# Altium footprint library WR-TBL_Pluggable PCB Header.PcbLib: 719 footprints (part 19 of 45)
Each footprint in its own frame and in the unit in brackets; x right, y up, seen from the top. Pads: shape width x height; smd on the part's side, far side on the other; paste and mask are expansions set on the pad; w line width, h text height; cw(c..) or ccw(c..) is an arc to the next point about the centre after c.
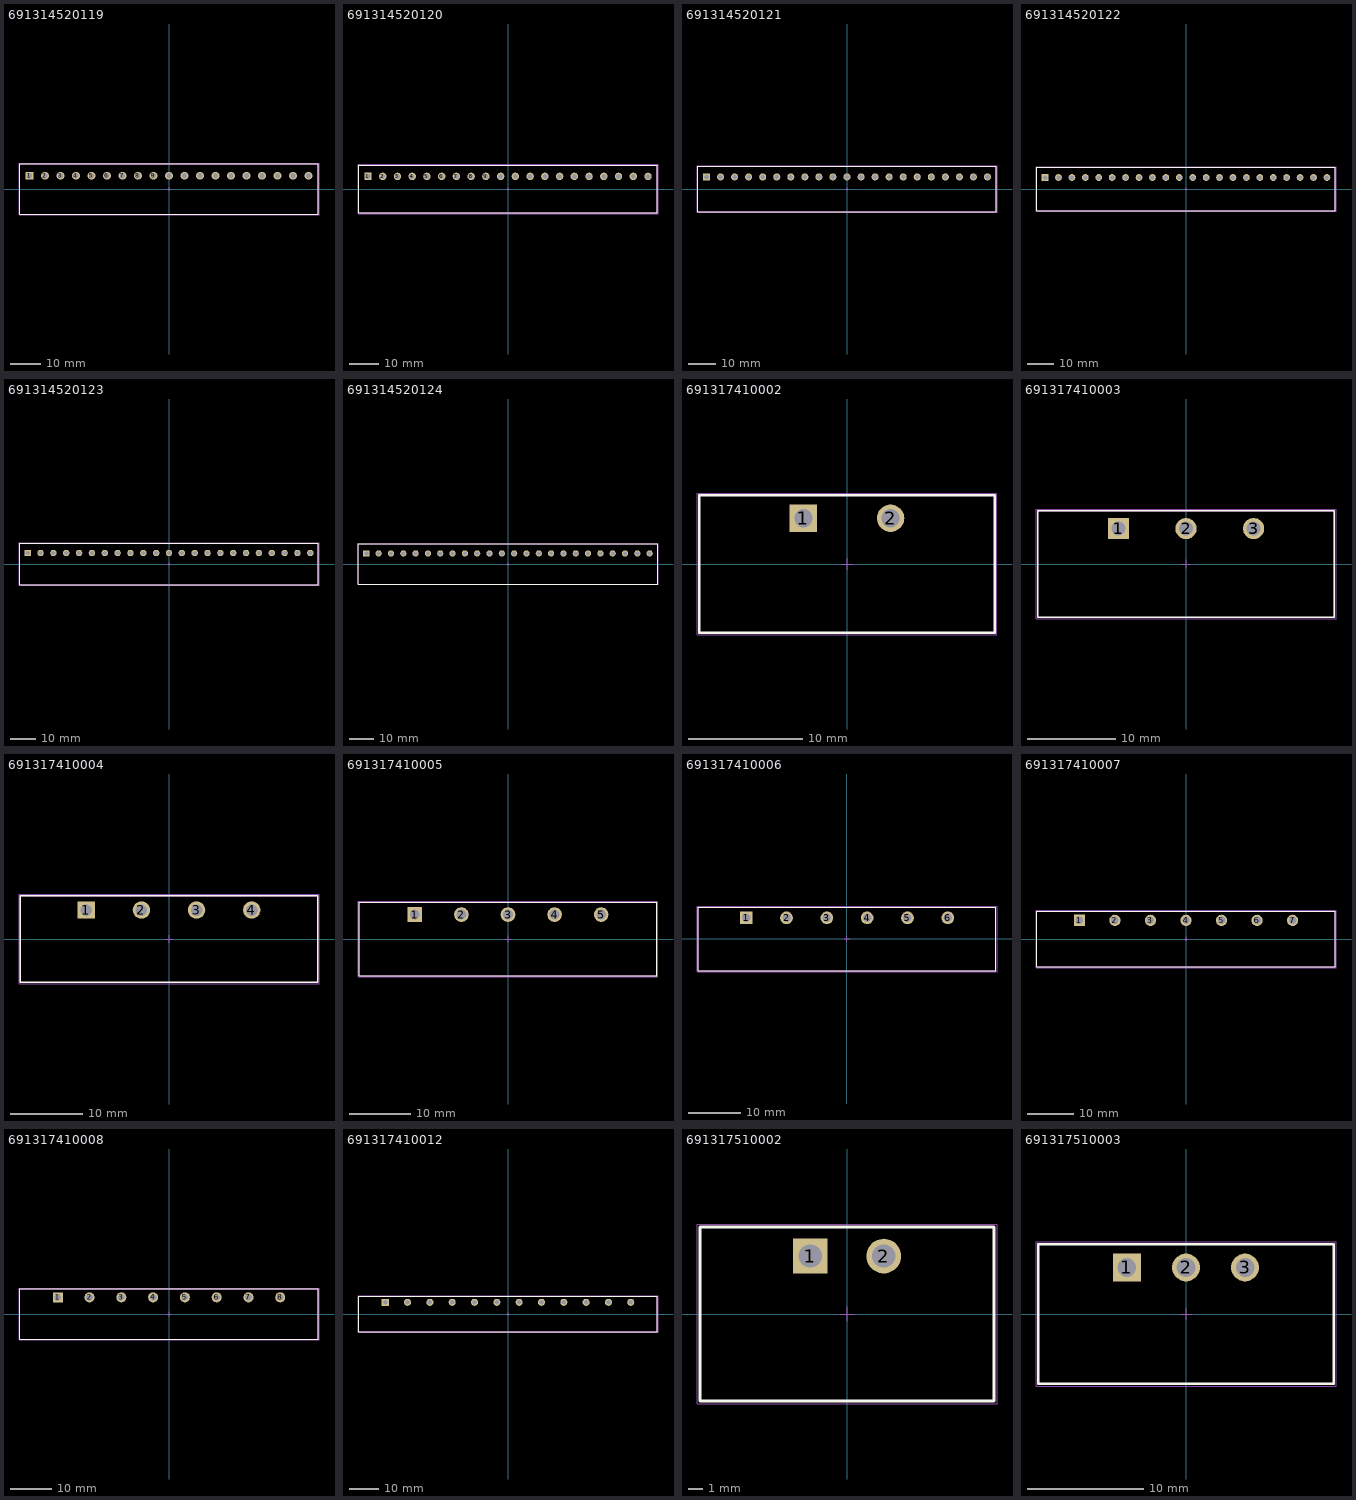
[diagram p18: the footprints below, top view; thin cyan lines are the x and y axes]

## 691314520119 [mm] "5,08mm - PCB Headers - 45°- 19p"
height 14.5
pads (19):
  rect 2.55x2.55 hole 1.7: 1(-45.72,4.35)
  round 2.55 hole 1.7: 2(-40.64,4.35) 3(-35.56,4.35) 4(-30.48,4.35) 5(-25.4,4.35) 6(-20.32,4.35) 7(-15.24,4.35) 8(-10.16,4.35) 9(-5.08,4.35) 10(0,4.35) 11(5.08,4.35) 12(10.16,4.35) 13(15.24,4.35) 14(20.32,4.35) 15(25.4,4.35) 16(30.48,4.35) 17(35.56,4.35) 18(40.64,4.35) 19(45.72,4.35)
Top Overlay:
  lines w0.2: -48.96,-8.25 48.96,-8.25 48.96,8.25 -48.96,8.25 -48.96,-8.25
Mechanical 13:
  lines w0.1: -48.96,-8.25 -48.96,8.25 48.96,8.25 48.96,-8.25 -48.96,-8.25
Mechanical 15:
  lines w0.05: -0.5,0 0.5,0 ; 0,-0.5 0,0.5 ; -49.16,-8.45 -49.16,8.45 49.16,8.45 49.16,-8.45 -49.16,-8.45
3D body "691314520119.stp": height 14.55, standoff -4.05, extent -48.96,-8.25 48.96,8.25

## 691314520120 [mm] "5,08mm - PCB Headers - 45°- 20p"
height 14.5
pads (20):
  rect 2.55x2.55 hole 1.7: 1(-48.26,4.35)
  round 2.55 hole 1.7: 2(-43.18,4.35) 3(-38.1,4.35) 4(-33.02,4.35) 5(-27.94,4.35) 6(-22.86,4.35) 7(-17.78,4.35) 8(-12.7,4.35) 9(-7.62,4.35) 10(-2.54,4.35) 11(2.54,4.35) 12(7.62,4.35) 13(12.7,4.35) 14(17.78,4.35) 15(22.86,4.35) 16(27.94,4.35) 17(33.02,4.35) 18(38.1,4.35) 19(43.18,4.35) 20(48.26,4.35)
Top Overlay:
  lines w0.2: -51.5,-8.25 -51.5,8.25 51.5,8.25 51.5,-8.25 -51.5,-8.25
Mechanical 13:
  lines w0.1: -51.5,-8.25 51.5,-8.25 51.5,8.25 -51.5,8.25 -51.5,-8.25
Mechanical 15:
  lines w0.05: -0.5,0 0.5,0 ; 0,-0.5 0,0.5 ; -51.7,-8.45 51.7,-8.45 51.7,8.45 -51.7,8.45 -51.7,-8.45
3D body "691314520120.stp": height 14.55, standoff -4.05, extent -51.5,-8.25 51.5,8.25

## 691314520121 [mm] "5,08mm - PCB Headers - 45°- 21p"
height 14.5
pads (21):
  rect 2.55x2.55 hole 1.7: 1(-50.8,4.35)
  round 2.55 hole 1.7: 2(-45.72,4.35) 3(-40.64,4.35) 4(-35.56,4.35) 5(-30.48,4.35) 6(-25.4,4.35) 7(-20.32,4.35) 8(-15.24,4.35) 9(-10.16,4.35) 10(-5.08,4.35) 11(0,4.35) 12(5.08,4.35) 13(10.16,4.35) 14(15.24,4.35) 15(20.32,4.35) 16(25.4,4.35) 17(30.48,4.35) 18(35.56,4.35) 19(40.64,4.35) 20(45.72,4.35) 21(50.8,4.35)
Top Overlay:
  lines w0.2: -54.04,-8.25 54.04,-8.25 54.04,8.25 -54.04,8.25 -54.04,-8.25
Mechanical 13:
  lines w0.1: -54.04,-8.25 -54.04,8.25 54.04,8.25 54.04,-8.25 -54.04,-8.25
Mechanical 15:
  lines w0.05: -0.5,0 0.5,0 ; 0,-0.5 0,0.5 ; -54.24,-8.45 -54.24,8.45 54.24,8.45 54.24,-8.45 -54.24,-8.45
3D body "691314520121.stp": height 14.55, standoff -4.05, extent -54.04,-8.25 54.04,8.25

## 691314520122 [mm] "5,08mm - PCB Headers - 45°- 22p"
height 14.5
pads (22):
  rect 2.55x2.55 hole 1.7: 1(-53.34,4.35)
  round 2.55 hole 1.7: 2(-48.26,4.35) 3(-43.18,4.35) 4(-38.1,4.35) 5(-33.02,4.35) 6(-27.94,4.35) 7(-22.86,4.35) 8(-17.78,4.35) 9(-12.7,4.35) 10(-7.62,4.35) 11(-2.54,4.35) 12(2.54,4.35) 13(7.62,4.35) 14(12.7,4.35) 15(17.78,4.35) 16(22.86,4.35) 17(27.94,4.35) 18(33.02,4.35) 19(38.1,4.35) 20(43.18,4.35) 21(48.26,4.35) 22(53.34,4.35)
Top Overlay:
  lines w0.2: -56.58,-8.25 -56.58,8.25 56.58,8.25 56.58,-8.25 -56.58,-8.25
Mechanical 13:
  lines w0.1: -56.58,-8.25 56.58,-8.25 56.58,8.25 -56.58,8.25 -56.58,-8.25
Mechanical 15:
  lines w0.05: -0.5,0 0.5,0 ; 0,-0.5 0,0.5 ; -56.78,-8.45 56.78,-8.45 56.78,8.45 -56.78,8.45 -56.78,-8.45
3D body "691314520122.stp": height 14.55, standoff -4.05, extent -56.58,-8.25 56.58,8.25

## 691314520123 [mm] "5,08mm - PCB Headers - 45°- 23p"
height 14.5
pads (23):
  rect 2.55x2.55 hole 1.7: 1(-55.88,4.35)
  round 2.55 hole 1.7: 2(-50.8,4.35) 3(-45.72,4.35) 4(-40.64,4.35) 5(-35.56,4.35) 6(-30.48,4.35) 7(-25.4,4.35) 8(-20.32,4.35) 9(-15.24,4.35) 10(-10.16,4.35) 11(-5.08,4.35) 12(0,4.35) 13(5.08,4.35) 14(10.16,4.35) 15(15.24,4.35) 16(20.32,4.35) 17(25.4,4.35) 18(30.48,4.35) 19(35.56,4.35) 20(40.64,4.35) 21(45.72,4.35) 22(50.8,4.35) 23(55.88,4.35)
Top Overlay:
  lines w0.2: -59.12,-8.25 -59.12,8.25 59.12,8.25 59.12,-8.25 -59.12,-8.25
Mechanical 13:
  lines w0.1: -59.12,-8.25 59.12,-8.25 59.12,8.25 -59.12,8.25 -59.12,-8.25
Mechanical 15:
  lines w0.05: -0.5,0 0.5,0 ; 0,-0.5 0,0.5 ; -59.32,-8.45 59.32,-8.45 59.32,8.45 -59.32,8.45 -59.32,-8.45
3D body "691314520123.stp": height 14.55, standoff -4.05, extent -59.12,-8.25 59.12,8.25

## 691314520124 [mm] "5,08mm - PCB Headers - 45°- 24p"
height 14.5
pads (24):
  rect 2.55x2.55 hole 1.7: 1(-58.42,4.35)
  round 2.55 hole 1.7: 2(-53.34,4.35) 3(-48.26,4.35) 4(-43.18,4.35) 5(-38.1,4.35) 6(-33.02,4.35) 7(-27.94,4.35) 8(-22.86,4.35) 9(-17.78,4.35) 10(-12.7,4.35) 11(-7.62,4.35) 12(-2.54,4.35) 13(2.54,4.35) 14(7.62,4.35) 15(12.7,4.35) 16(17.78,4.35) 17(22.86,4.35) 18(27.94,4.35) 19(33.02,4.35) 20(38.1,4.35) 21(43.18,4.35) 22(48.26,4.35) 23(53.34,4.35) 24(58.42,4.35)
Top Overlay:
  lines w0.2: -61.66,-8.25 -61.66,8.25 61.66,8.25 61.66,-8.25 -61.66,-8.25
Mechanical 13:
  lines w0.1: -61.66,-8.25 61.66,-8.25 61.66,8.25 -61.66,8.25 -61.66,-8.25
Mechanical 15:
  lines w0.05: -0.5,0 0.5,0 ; 0,-0.5 0,0.5 ; -61.86,-8.45 61.86,-8.45 61.86,8.45 -61.86,8.45 -61.86,-8.45
3D body "691314520124.stp": height 14.55, standoff -4.05, extent -61.66,-8.25 61.66,8.25

## 691317410002 [mm] "7.62 mm - Closed Horizonal PCB Header with Flanges - 2p"
height 8.5
pads (2):
  rect 2.4x2.4 hole 1.6: 1(-3.81,4)
  round 2.4 hole 1.6: 2(3.81,4)
Top Overlay:
  lines w0.2: -12.91,-6 -12.91,6 12.91,6 12.91,-6 -12.91,-6
Mechanical 13:
  lines w0.1: -12.91,-6 12.91,-6 12.91,6 -12.91,6 -12.91,-6
Mechanical 15:
  lines w0.05: -0.5,0 0.5,0 ; 0,-0.5 0,0.5 ; -13.11,-6.2 -13.11,6.2 13.11,6.2 13.11,-6.2 -13.11,-6.2
3D body "691317410002.stp": height 8.55, standoff -3.95, extent -12.91,-6 12.91,6

## 691317410003 [mm] "7.62 mm - Closed Horizonal PCB Header with Flanges - 3p"
height 8.5
pads (3):
  rect 2.4x2.4 hole 1.6: 1(-7.62,4)
  round 2.4 hole 1.6: 2(0,4) 3(7.62,4)
Top Overlay:
  lines w0.2: -16.72,-6 16.72,-6 16.72,6 -16.72,6 -16.72,-6
Mechanical 13:
  lines w0.1: -16.72,-6 -16.72,6 16.72,6 16.72,-6 -16.72,-6
Mechanical 15:
  lines w0.05: -0.5,0 0.5,0 ; 0,-0.5 0,0.5 ; -16.92,-6.2 16.92,-6.2 16.92,6.2 -16.92,6.2 -16.92,-6.2
3D body "691317410003.stp": height 8.55, standoff -3.95, extent -16.72,-6 16.72,6

## 691317410004 [mm] "7.62 mm - Closed Horizonal PCB Header with Flanges - 4p"
height 8.5
pads (4):
  rect 2.4x2.4 hole 1.6: 1(-11.43,4)
  round 2.4 hole 1.6: 2(-3.81,4) 3(3.81,4) 4(11.43,4)
Top Overlay:
  lines w0.2: -20.53,-6 20.53,-6 20.53,6 -20.53,6 -20.53,-6
Mechanical 13:
  lines w0.1: -20.53,-6 -20.53,6 20.53,6 20.53,-6 -20.53,-6
Mechanical 15:
  lines w0.05: -0.5,0 0.5,0 ; 0,-0.5 0,0.5 ; -20.73,-6.2 20.73,-6.2 20.73,6.2 -20.73,6.2 -20.73,-6.2
3D body "691317410004.stp": height 8.55, standoff -3.95, extent -20.53,-6 20.53,6

## 691317410005 [mm] "7.62 mm - Closed Horizonal PCB Header with Flanges - 5p"
height 8.5
pads (5):
  rect 2.4x2.4 hole 1.6: 1(-15.24,4)
  round 2.4 hole 1.6: 2(-7.62,4) 3(0,4) 4(7.62,4) 5(15.24,4)
Top Overlay:
  lines w0.2: -24.34,-6 24.34,-6 24.34,6 -24.34,6 -24.34,-6
Mechanical 13:
  lines w0.1: -24.34,-6 -24.34,6 24.34,6 24.34,-6 -24.34,-6
Mechanical 15:
  lines w0.05: -0.5,0 0.5,0 ; 0,-0.5 0,0.5 ; -24.54,-6.2 24.54,-6.2 24.54,6.2 -24.54,6.2 -24.54,-6.2
3D body "691317410005.stp": height 8.55, standoff -3.95, extent -24.34,-6 24.34,6

## 691317410006 [mm] "7.62 mm - Closed Horizonal PCB Header with Flanges - 6p"
height 8.5
pads (6):
  rect 2.4x2.4 hole 1.6: 1(-19.05,4)
  round 2.4 hole 1.6: 2(-11.43,4) 3(-3.81,4) 4(3.81,4) 5(11.43,4) 6(19.05,4)
Top Overlay:
  lines w0.2: -28.15,-6 -28.15,6 28.15,6 28.15,-6 -28.15,-6
Mechanical 13:
  lines w0.1: -28.15,-6 28.15,-6 28.15,6 -28.15,6 -28.15,-6
Mechanical 15:
  lines w0.05: -0.5,0 0.5,0 ; 0,-0.5 0,0.5 ; -28.35,-6.2 -28.35,6.2 28.35,6.2 28.35,-6.2 -28.35,-6.2
3D body "691317410006.stp": height 8.55, standoff -3.95, extent -28.15,-6 28.15,6

## 691317410007 [mm] "7.62 mm - Closed Horizonal PCB Header with Flanges - 7p"
height 8.5
pads (7):
  rect 2.4x2.4 hole 1.6: 1(-22.86,4)
  round 2.4 hole 1.6: 2(-15.24,4) 3(-7.62,4) 4(0,4) 5(7.62,4) 6(15.24,4) 7(22.86,4)
Top Overlay:
  lines w0.2: -31.96,-6 -31.96,6 31.96,6 31.96,-6 -31.96,-6
Mechanical 13:
  lines w0.1: -31.96,-6 31.96,-6 31.96,6 -31.96,6 -31.96,-6
Mechanical 15:
  lines w0.05: -0.5,0 0.5,0 ; 0,-0.5 0,0.5 ; -32.16,-6.2 -32.16,6.2 32.16,6.2 32.16,-6.2 -32.16,-6.2
3D body "691317410007.stp": height 8.55, standoff -3.95, extent -31.96,-6 31.96,6

## 691317410008 [mm] "7.62 mm - Closed Horizonal PCB Header with Flanges - 8p"
height 8.5
pads (8):
  rect 2.4x2.4 hole 1.6: 1(-26.67,4)
  round 2.4 hole 1.6: 2(-19.05,4) 3(-11.43,4) 4(-3.81,4) 5(3.81,4) 6(11.43,4) 7(19.05,4) 8(26.67,4)
Top Overlay:
  lines w0.2: -35.77,-6 -35.77,6 35.77,6 35.77,-6 -35.77,-6
Mechanical 13:
  lines w0.1: -35.77,-6 35.77,-6 35.77,6 -35.77,6 -35.77,-6
Mechanical 15:
  lines w0.05: -0.5,0 0.5,0 ; 0,-0.5 0,0.5 ; -35.97,-6.2 -35.97,6.2 35.97,6.2 35.97,-6.2 -35.97,-6.2
3D body "691317410008.stp": height 8.55, standoff -3.95, extent -35.77,-6 35.77,6

## 691317410012 [mm] "7.62 mm - Closed Horizonal PCB Header with Flanges - 12p"
height 8.5
pads (12):
  rect 2.4x2.4 hole 1.6: 1(-41.91,4)
  round 2.4 hole 1.6: 2(-34.29,4) 3(-26.67,4) 4(-19.05,4) 5(-11.43,4) 6(-3.81,4) 7(3.81,4) 8(11.43,4) 9(19.05,4) 10(26.67,4) 11(34.29,4) 12(41.91,4)
Top Overlay:
  lines w0.2: -51.01,-6 -51.01,6 51.01,6 51.01,-6 -51.01,-6
Mechanical 13:
  lines w0.1: -51.01,-6 51.01,-6 51.01,6 -51.01,6 -51.01,-6
Mechanical 15:
  lines w0.05: -0.5,0 0.5,0 ; 0,-0.5 0,0.5 ; -51.21,-6.2 -51.21,6.2 51.21,6.2 51.21,-6.2 -51.21,-6.2
3D body "691317410012.stp": height 8.55, standoff -3.95, extent -51.01,-6 51.01,6

## 691317510002 [mm] "5,08mm - PCB Horizontal Closed With flanges - 02p"
height 8.5
pads (2):
  rect 2.4x2.4 hole 1.6: 1(-2.54,4)
  round 2.4 hole 1.6: 2(2.54,4)
Top Overlay:
  lines w0.2: -10.16,-6 10.16,-6 10.16,6 -10.16,6 -10.16,-6
Mechanical 13:
  lines w0.1: -10.16,-6 -10.16,6 10.16,6 10.16,-6 -10.16,-6
Mechanical 15:
  lines w0.05: -0.5,0 0.5,0 ; 0,-0.5 0,0.5 ; -10.36,-6.2 -10.36,6.2 10.36,6.2 10.36,-6.2 -10.36,-6.2
3D body "691317510002.stp": height 8.55, standoff -3.45, extent -10.16,-6 10.16,6

## 691317510003 [mm] "5,08mm - PCB Horizontal Closed With flanges - 03p"
height 8.5
pads (3):
  rect 2.4x2.4 hole 1.6: 1(-5.08,4)
  round 2.4 hole 1.6: 2(0,4) 3(5.08,4)
Top Overlay:
  lines w0.2: -12.7,-6 -12.7,6 12.7,6 12.7,-6 -12.7,-6
Mechanical 13:
  lines w0.1: -12.7,-6 12.7,-6 12.7,6 -12.7,6 -12.7,-6
Mechanical 15:
  lines w0.05: -0.5,0 0.5,0 ; 0,-0.5 0,0.5 ; -12.9,-6.2 12.9,-6.2 12.9,6.2 -12.9,6.2 -12.9,-6.2
3D body "691317510003.stp": height 8.55, standoff -3.45, extent -12.7,-6 12.7,6